# Altium footprint library 14-Inductors.PcbLib: 164 footprints (part 6 of 11)
Each footprint in its own frame and in the unit in brackets; x right, y up, seen from the top. Pads: shape width x height; smd on the part's side, far side on the other; paste and mask are expansions set on the pad; w line width, h text height; cw(c..) or ccw(c..) is an arc to the next point about the centre after c.
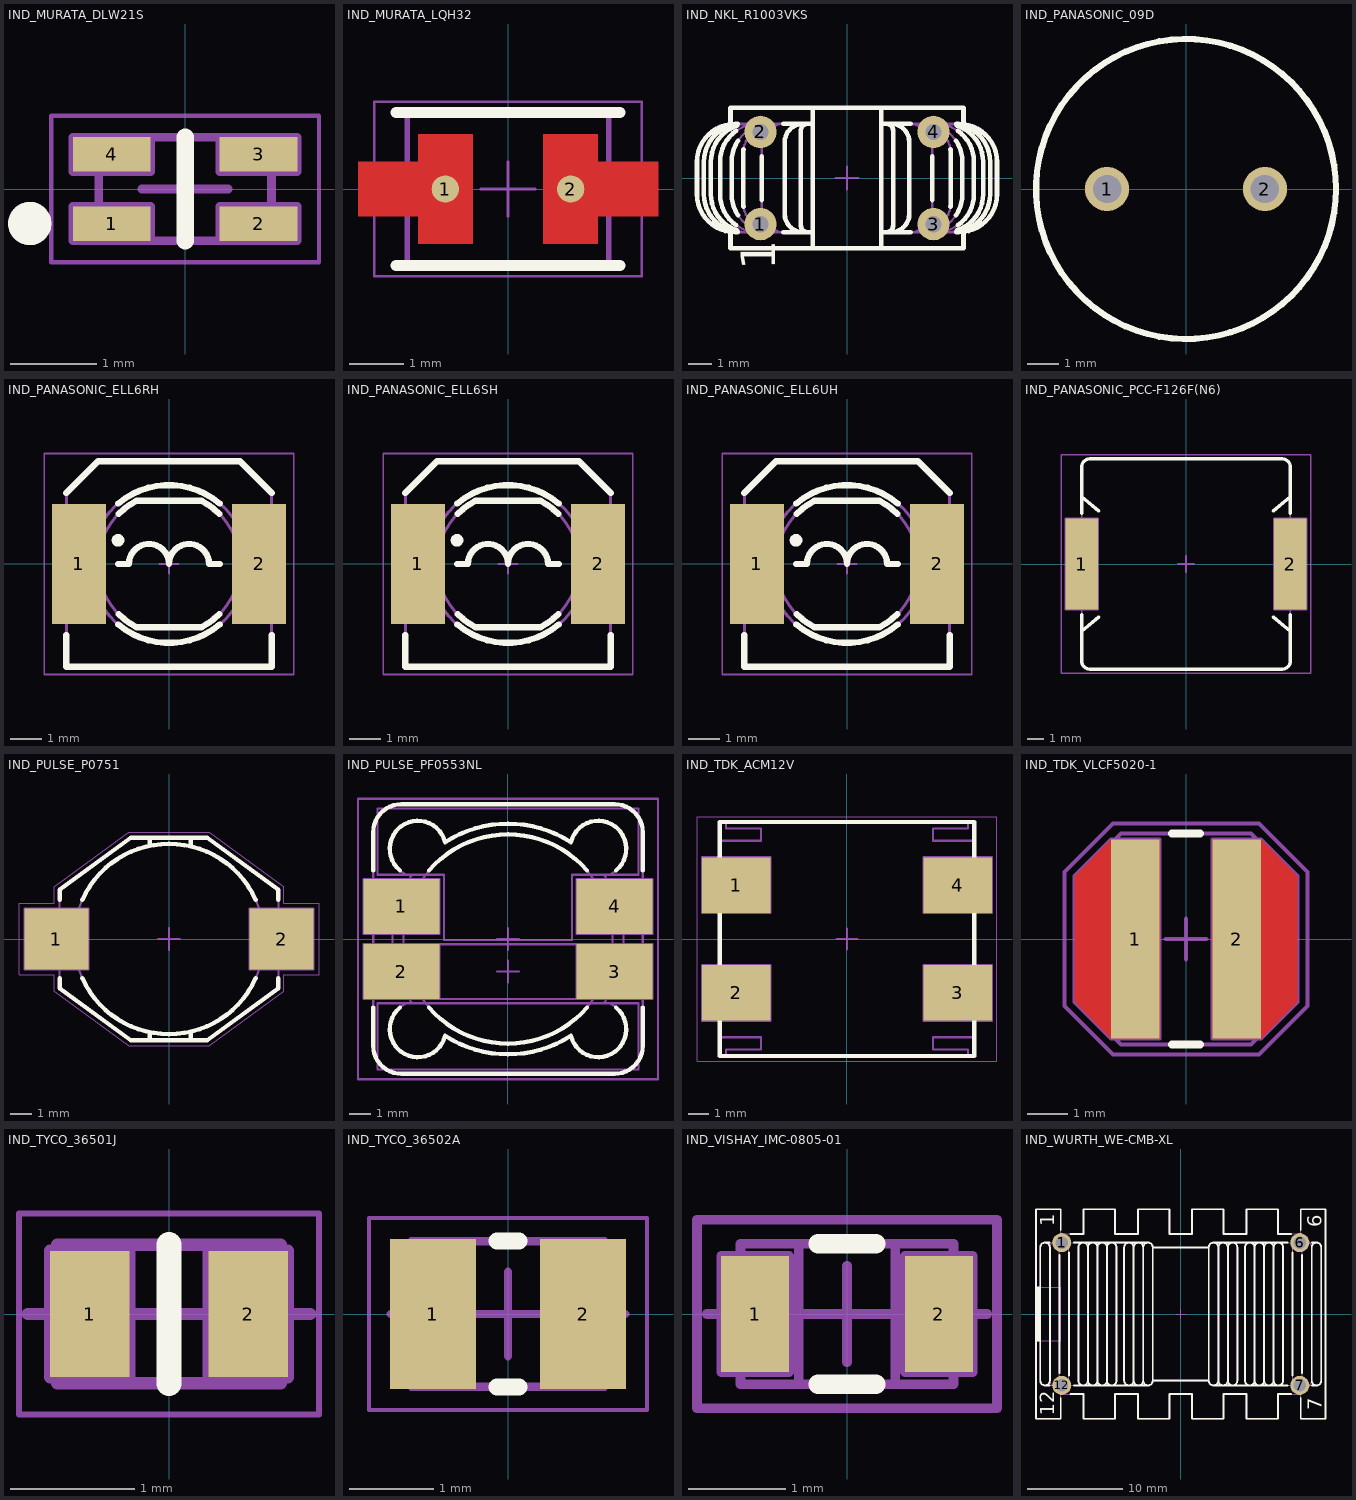
[diagram p5: the footprints below, top view; thin cyan lines are the x and y axes]

## IND_MURATA_DLW21S [mm] "Common Mode Choke Coil, DLW21S Series - Body 2 x 1.2mm"
height 1.4
pads (4):
  rect 0.9x0.4 smd: 1(-0.85,-0.4) 2(0.85,-0.4) 3(0.85,0.4) 4(-0.85,0.4)
Top Overlay:
  circle w0.25: c-1.8,-0.4 r0.125
  lines w0.2: 0,-0.6 0,0.6
Mechanical 8:
  lines w0.1: -0.5,0 0,0 ; 0,-0.5 0,0 ; 0,0.5 0,0 ; 0.5,0 0,0 ; -1.3,-0.6 -0.4,-0.6 -0.4,-0.2 -1.3,-0.2 ; -1.3,-0.6 -1.3,-0.2 ; -1.3,-0.6 -0.85,-0.4 -1.3,-0.2 ; -1.3,0.2 -0.4,0.2 -0.4,0.6 -1.3,0.6 ; -1.3,0.2 -1.3,0.6 ; -1.3,0.2 -0.85,0.4 -1.3,0.6 ; 1.3,-0.6 1.3,-0.2 ; 1.3,-0.6 1.3,-0.2 ; 1.3,-0.6 0.4,-0.6 0.4,-0.2 1.3,-0.2 ; 1.3,-0.6 0.85,-0.4 1.3,-0.2 ; 1.3,0.2 1.3,0.6 ; 1.3,0.2 1.3,0.6 ; 1.3,0.2 0.4,0.2 0.4,0.6 1.3,0.6 ; 1.3,0.2 0.85,0.4 1.3,0.6
Mechanical 14:
  circle w0.25: c-1.8,-0.4 r0.125
  lines w0.1: -1,-0.6 1,-0.6 1,0.6 -1,0.6 -1,-0.6
Mechanical 15:
  lines w0.05: -1.55,-0.85 1.55,-0.85 1.55,0.85 -1.55,0.85 -1.55,-0.85
3D body "IND_MURATA_DLW21S.stp": height 1.4, standoff 0, extent -1,-0.6 1,0.6

## IND_MURATA_LQH32 [mm] "Chip Inductor, 3.40mm L X 2.50mm W X 2.20mm H, MURATA LQH32 Serie"
height 2.2
pads (2):
  round 0.5 smd paste-0.26 mask-0.26: 1(-1.15,0) 2(1.15,0)
Top Layer:
  region: -2.75,-0.5 -1.65,-0.5 -1.65,-1 -0.65,-1 -0.65,1 -1.65,1 -1.65,0.5 -2.75,0.5
  region: 2.75,0.5 1.65,0.5 1.65,1 0.65,1 0.65,-1 1.65,-1 1.65,-0.5 2.75,-0.5
Top Overlay:
  lines w0.2: -2.05,-1.4 2.05,-1.4 ; -2.05,1.4 2.05,1.4
Mechanical 14:
  lines w0.1: -1.85,-1.35 1.85,-1.35 1.85,1.35 -1.85,1.35 -1.85,-1.35
Mechanical 15:
  lines w0.05: -0.5,0 0.5,0 ; 0,-0.5 0,0.5 ; -2.45,-1.6 2.45,-1.6 2.45,1.6 -2.45,1.6 -2.45,-1.6
3D body "IND_MURATA_LQH32.stp": height 2.2, standoff 0, extent -1.75,-1.25 1.75,1.25

## IND_NKL_R1003VKS [mm] "Current Compensated Chokes R1003VKS Serie"
height 13
pads (4):
  round 1.4 hole 0.7: 1(-3.75,-2) 2(-3.75,2) 3(3.75,-2) 4(3.75,2)
Top Overlay:
  lines w0.2: -5.05,-2.338 -5.05,-3.05 5.05,-3.05 5.05,-2.338 ; -5.05,2.338 -5.05,3.05 5.05,3.05 5.05,2.338 ; -4.799,-2.05 cw(c-3.85,-0.7) -5.5,-0.7 -5.5,0.7 cw(c-3.85,0.7) -4.799,2.05 ; -4.765,-2.267 cw(c-4.25,-0.7) -5.9,-0.7 -5.9,0.7 cw(c-4.25,0.7) -4.765,2.267 ; -4.744,-2.339 cw(c-4.55,-0.7) -6.2,-0.7 -6.2,0.7 cw(c-4.55,0.7) -4.744,2.339 ; -4.74,-2.35 -4.85,-2.35 cw(c-4.85,-0.7) -6.5,-0.7 -6.5,0.7 cw(c-4.85,0.7) -4.85,2.35 -4.74,2.35 ; -4.725,-1.611 cw(c-3.35,-0.7) -5,-0.7 -5,0.7 cw(c-3.35,0.7) -4.725,1.611 ; -4.485,-1.25 cw(c-3.2,-1.05) -4.5,-1.05 -4.5,1.05 cw(c-3.2,1.05) -4.485,1.25 ; -3.7,-0.951 -3.7,0.951 ; -2.76,-2.35 -1.49,-2.35 ; -2.759,-2.348 ccw(c-2.7,-1.35) -2.7,-2.35 ; -2.759,2.348 cw(c-2.7,1.35) -2.7,2.35 ; -2.76,2.35 -1.49,2.35 ; -1.9,-2.35 cw(c-1.9,-1.55) -2.7,-1.55 -2.7,1.55 cw(c-1.9,1.55) -1.9,2.35 ; -1.7,-2.35 cw(c-1.7,-2.05) -2,-2.05 -2,2.05 cw(c-1.7,2.05) -1.7,2.35 ; -1.49,-3.05 -1.49,3.05 ; 1.49,-3.05 1.49,3.05 ; 1.49,-2.35 2.76,-2.35 ; 1.49,2.35 2.76,2.35 ; 1.7,-2.35 ccw(c1.7,-2.05) 2,-2.05 2,2.05 ccw(c1.7,2.05) 1.7,2.35 ; 1.9,-2.35 ccw(c1.9,-1.55) 2.7,-1.55 2.7,1.55 ccw(c1.9,1.55) 1.9,2.35 ; 2.7,-2.35 ccw(c2.7,-1.35) 2.759,-2.348 ; 2.7,2.35 cw(c2.7,1.35) 2.759,2.348 ; 3.7,-0.951 3.7,0.951 ; 4.485,-1.25 ccw(c3.2,-1.05) 4.5,-1.05 4.5,1.05 ccw(c3.2,1.05) 4.485,1.25 ; 4.725,-1.611 ccw(c3.35,-0.7) 5,-0.7 5,0.7 ccw(c3.35,0.7) 4.725,1.611 ; 4.74,-2.35 4.85,-2.35 ccw(c4.85,-0.7) 6.5,-0.7 6.5,0.7 ccw(c4.85,0.7) 4.85,2.35 4.74,2.35 ; 4.744,-2.339 ccw(c4.55,-0.7) 6.2,-0.7 6.2,0.7 ccw(c4.55,0.7) 4.744,2.339 ; 4.765,-2.267 ccw(c4.25,-0.7) 5.9,-0.7 5.9,0.7 ccw(c4.25,0.7) 4.765,2.267 ; 4.799,-2.05 ccw(c3.85,-0.7) 5.5,-0.7 5.5,0.7 ccw(c3.85,0.7) 4.799,2.05
  text "1" at -3.1,-4 h1.5
Mechanical 8:
  lines w0.1: -4.25,-2 -3.75,-2 ; -4.25,2 -3.75,2 ; -3.75,-2.5 -3.75,-2 ; -3.75,-1.5 -3.75,-2 ; -3.75,1.5 -3.75,2 ; -3.75,2.5 -3.75,2 ; -3.25,-2 -3.75,-2 ; -3.25,2 -3.75,2 ; -0.5,0 0,0 ; 0,-0.5 0,0 ; 0,0.5 0,0 ; 0.5,0 0,0 ; 3.25,-2 3.75,-2 ; 3.25,2 3.75,2 ; 3.75,-2.5 3.75,-2 ; 3.75,-1.5 3.75,-2 ; 3.75,1.5 3.75,2 ; 3.75,2.5 3.75,2 ; 4.25,-2 3.75,-2 ; 4.25,2 3.75,2
Mechanical 14:
  lines w0.1: -5.05,-2.338 -5.05,-3.05 5.05,-3.05 5.05,-2.338 ; -5.05,2.338 -5.05,3.05 5.05,3.05 5.05,2.338 ; -4.55,-2.35 cw(c-4.55,-0.7) -6.2,-0.7 -6.2,0.7 cw(c-4.55,0.7) -4.55,2.35 ; -4.25,-2.35 cw(c-4.25,-0.7) -5.9,-0.7 -5.9,0.7 cw(c-4.25,0.7) -4.25,2.35 ; -3.85,-2.35 cw(c-3.85,-0.7) -5.5,-0.7 -5.5,0.7 cw(c-3.85,0.7) -3.85,2.35 ; -3.35,-2.35 cw(c-3.35,-0.7) -5,-0.7 -5,0.7 cw(c-3.35,0.7) -3.35,2.35 ; -3.2,-2.35 cw(c-3.2,-1.05) -4.5,-1.05 -4.5,1.05 cw(c-3.2,1.05) -3.2,2.35 ; -2.7,-2.35 cw(c-2.7,-1.35) -3.7,-1.35 -3.7,1.35 cw(c-2.7,1.35) -2.7,2.35 ; -1.9,-2.35 cw(c-1.9,-1.55) -2.7,-1.55 -2.7,1.55 cw(c-1.9,1.55) -1.9,2.35 ; -1.7,-2.35 cw(c-1.7,-2.05) -2,-2.05 -2,2.05 cw(c-1.7,2.05) -1.7,2.35 ; -1.49,-3.05 -1.49,3.05 ; -1.49,-2.35 -4.85,-2.35 cw(c-4.85,-0.7) -6.5,-0.7 -6.5,0.7 cw(c-4.85,0.7) -4.85,2.35 -1.49,2.35 ; 1.49,-3.05 1.49,3.05 ; 1.49,-2.35 4.85,-2.35 ccw(c4.85,-0.7) 6.5,-0.7 6.5,0.7 ccw(c4.85,0.7) 4.85,2.35 1.49,2.35 ; 1.7,-2.35 ccw(c1.7,-2.05) 2,-2.05 2,2.05 ccw(c1.7,2.05) 1.7,2.35 ; 1.9,-2.35 ccw(c1.9,-1.55) 2.7,-1.55 2.7,1.55 ccw(c1.9,1.55) 1.9,2.35 ; 2.7,-2.35 ccw(c2.7,-1.35) 3.7,-1.35 3.7,1.35 ccw(c2.7,1.35) 2.7,2.35 ; 3.2,-2.35 ccw(c3.2,-1.05) 4.5,-1.05 4.5,1.05 ccw(c3.2,1.05) 3.2,2.35 ; 3.35,-2.35 ccw(c3.35,-0.7) 5,-0.7 5,0.7 ccw(c3.35,0.7) 3.35,2.35 ; 3.85,-2.35 ccw(c3.85,-0.7) 5.5,-0.7 5.5,0.7 ccw(c3.85,0.7) 3.85,2.35 ; 4.25,-2.35 ccw(c4.25,-0.7) 5.9,-0.7 5.9,0.7 ccw(c4.25,0.7) 4.25,2.35 ; 4.55,-2.35 ccw(c4.55,-0.7) 6.2,-0.7 6.2,0.7 ccw(c4.55,0.7) 4.55,2.35
  text "1" at -3.1,-4 h1.5
3D body "IND_NKL_R1003VKS.stp": height 13, standoff -3.6, extent -6.5,-3.05 6.5,3.05

## IND_PANASONIC_09D [mm] "Radial Leaded Wire Wound Inductor D=9.5mm"
height 8.9
pads (2):
  round 1.4 hole 0.9: 1(-2.5,0) 2(2.5,0)
Top Overlay:
  circle w0.2: c0,0 r4.75
Mechanical 14:
  circle w0.1: c0,0 r4.75
3D body "IND_PANASONIC_09D.stp": height 8.9, standoff -4.1, extent -4.75,-4.75 4.75,4.75

## IND_PANASONIC_ELL6RH [mm] "SMD Choke Coil, Body 6.9x6.5mm"
height 2.8
pads (2):
  rect 1.7x3.8 smd: 1(-2.85,0) 2(2.85,0)
Top Overlay:
  circle w0.2: c-1.615,0.75 r0.1
  lines w0.2: -3.25,-2.25 -3.25,-3.25 3.25,-3.25 3.25,-2.25 ; -3.25,2.25 -2.25,3.25 2.25,3.25 3.25,2.25 ; -1.615,0 -1.27,0 cw(c-0.635,0) 0,0 cw(c0.635,0) 1.27,0 1.615,0 ; -1.607,-1.915 ccw(c0,0) 1.607,-1.915 ; -1.607,1.915 cw(c0,0) 1.607,1.915 ; -1.591,-1.591 ccw(c0,0) -1.031,-2 1.031,-2 ccw(c0,0) 1.591,-1.591 ; -1.591,1.591 cw(c0,0) -1.031,2 1.031,2 cw(c0,0) 1.591,1.591
Mechanical 14:
  circle w0.1: c0,0 r2.5
  lines w0.1: -3.25,-1.65 -3.45,-1.65 -3.45,1.65 -3.25,1.65 ; 3.25,-1.65 3.45,-1.65 3.45,1.65 3.25,1.65 ; -3.25,-3.25 -3.25,2.25 -2.25,3.25 2.25,3.25 3.25,2.25 3.25,-3.25 -3.25,-3.25 ; -1.031,-2 cw(c0,0) -1.031,2 1.031,2 cw(c0,0) 1.031,-2 -1.031,-2
Mechanical 15:
  lines w0.05: -0.3,0 0.3,0 ; 0,-0.3 0,0.3 ; -3.95,-3.5 -3.95,3.5 3.95,3.5 3.95,-3.5 -3.95,-3.5
3D body "IND_PANASONIC_ELL6RH.stp": height 2.8, standoff 0, extent -3.45,-3.25 3.45,3.25

## IND_PANASONIC_ELL6SH [mm] "SMD Choke Coil, Body 6.9x6.5mm"
height 3.3
pads (2):
  rect 1.7x3.8 smd: 1(-2.85,0) 2(2.85,0)
Top Overlay:
  circle w0.2: c-1.615,0.75 r0.1
  lines w0.2: -3.25,-2.25 -3.25,-3.25 3.25,-3.25 3.25,-2.25 ; -3.25,2.25 -2.25,3.25 2.25,3.25 3.25,2.25 ; -1.615,0 -1.27,0 cw(c-0.635,0) 0,0 cw(c0.635,0) 1.27,0 1.615,0 ; -1.607,-1.915 ccw(c0,0) 1.607,-1.915 ; -1.607,1.915 cw(c0,0) 1.607,1.915 ; -1.591,-1.591 ccw(c0,0) -1.031,-2 1.031,-2 ccw(c0,0) 1.591,-1.591 ; -1.591,1.591 cw(c0,0) -1.031,2 1.031,2 cw(c0,0) 1.591,1.591
Mechanical 14:
  circle w0.1: c0,0 r2.5
  lines w0.1: -3.25,-1.65 -3.45,-1.65 -3.45,1.65 -3.25,1.65 ; 3.25,-1.65 3.45,-1.65 3.45,1.65 3.25,1.65 ; -3.25,-3.25 -3.25,2.25 -2.25,3.25 2.25,3.25 3.25,2.25 3.25,-3.25 -3.25,-3.25 ; -1.031,-2 cw(c0,0) -1.031,2 1.031,2 cw(c0,0) 1.031,-2 -1.031,-2
Mechanical 15:
  lines w0.05: -0.3,0 0.3,0 ; 0,-0.3 0,0.3 ; -3.95,-3.5 -3.95,3.5 3.95,3.5 3.95,-3.5 -3.95,-3.5
3D body "IND_PANASONIC_ELL6SH.stp": height 3.3, standoff 0, extent -3.45,-3.25 3.45,3.25

## IND_PANASONIC_ELL6UH [mm] "SMD Choke Coil, Body 6.9x6.5mm"
height 5
pads (2):
  rect 1.7x3.8 smd: 1(-2.85,0) 2(2.85,0)
Top Overlay:
  circle w0.2: c-1.615,0.75 r0.1
  lines w0.2: -3.25,-2.25 -3.25,-3.25 3.25,-3.25 3.25,-2.25 ; -3.25,2.25 -2.25,3.25 2.25,3.25 3.25,2.25 ; -1.615,0 -1.27,0 cw(c-0.635,0) 0,0 cw(c0.635,0) 1.27,0 1.615,0 ; -1.607,-1.915 ccw(c0,0) 1.607,-1.915 ; -1.607,1.915 cw(c0,0) 1.607,1.915 ; -1.591,-1.591 ccw(c0,0) -1.031,-2 1.031,-2 ccw(c0,0) 1.591,-1.591 ; -1.591,1.591 cw(c0,0) -1.031,2 1.031,2 cw(c0,0) 1.591,1.591
Mechanical 14:
  circle w0.1: c0,0 r2.5
  lines w0.1: -3.25,-1.65 -3.45,-1.65 -3.45,1.65 -3.25,1.65 ; 3.25,-1.65 3.45,-1.65 3.45,1.65 3.25,1.65 ; -3.25,-3.25 3.25,-3.25 3.25,2.25 2.25,3.25 -2.25,3.25 -3.25,2.25 -3.25,-3.25 ; -1.031,-2 cw(c0,0) -1.031,2 1.031,2 cw(c0,0) 1.031,-2 -1.031,-2
Mechanical 15:
  lines w0.05: -0.3,0 0.3,0 ; 0,-0.3 0,0.3 ; -3.95,-3.5 3.95,-3.5 3.95,3.5 -3.95,3.5 -3.95,-3.5
3D body "IND_PANASONIC_ELL6UH.stp": height 5, standoff 0, extent -3.45,-3.25 3.45,3.25

## IND_PANASONIC_PCC-F126F(N6) [mm] "SMD Inductor  Body Width 12.5mm Body Lenght 12.5mm Height 5.7mm, PANASONIC PCC-F126(N6) Serie"
height 5.7
pads (2):
  rect 2x5.6 smd: 1(-6.4,0) 2(6.4,0)
Top Overlay:
  lines w0.2: -6.4,-4.125 -5.35,-3.25 ; -6.4,-3.1 -6.4,-5.95 ccw(c-5.9,-5.95) -5.9,-6.45 5.9,-6.45 ccw(c5.9,-5.95) 6.4,-5.95 6.4,-3.1 ; -6.4,3.1 -6.4,5.95 cw(c-5.9,5.95) -5.9,6.45 5.9,6.45 cw(c5.9,5.95) 6.4,5.95 6.4,3.1 ; -6.4,4.125 -5.35,3.25 ; 5.35,-3.25 6.4,-4.125 ; 5.35,3.25 6.4,4.125
Mechanical 8:
  lines w0.1: -6.9,0 -6.4,0 ; -6.4,-0.5 -6.4,0 ; -6.4,0.5 -6.4,0 ; -5.9,0 -6.4,0 ; -0.5,0 0,0 ; 0,-0.5 0,0 ; 0,0.5 0,0 ; 0.5,0 0,0 ; 5.9,0 6.4,0 ; 6.4,-0.5 6.4,0 ; 6.4,0.5 6.4,0 ; 6.9,0 6.4,0 ; -7.4,-2.8 -7.4,2.8 -5.4,2.8 -5.4,-2.8 -7.4,-2.8 ; 5.4,-2.8 5.4,2.8 7.4,2.8 7.4,-2.8 5.4,-2.8
Mechanical 14:
  lines w0.1: -6.4,-5.95 ccw(c-5.9,-5.95) -5.9,-6.45 5.9,-6.45 ccw(c5.9,-5.95) 6.4,-5.95 6.4,5.95 ccw(c5.9,5.95) 5.9,6.45 -5.9,6.45 ccw(c-5.9,5.95) -6.4,5.95 -6.4,-5.95
Mechanical 15:
  lines w0.1: -7.65,-6.7 7.65,-6.7 7.65,6.7 -7.65,6.7 -7.65,-6.7
3D body "IND_PANASONIC_PCC-F126F(N6).stp": height 5.7, standoff -0.3, extent -6.25,-6.25 6.25,6.25

## IND_PULSE_P0751 [mm] "SMD Power Inductor, Body Width 9.4mm Body Lenght 12.95mm Height 5.46mm, PULSE P0751/52NL Serie"
height 5.46
pads (2):
  rect 2.92x2.79 smd: 1(-5.145,0) 2(5.145,0)
Top Overlay:
  lines w0.2: -5,-1.795 -5,-2.25 -1.75,-4.625 1.75,-4.625 5,-2.25 5,-1.795 ; -5,1.795 -5,2.25 -1.75,4.625 1.75,4.625 5,2.25 5,1.795 ; -3.962,-1.795 ccw(c0,0) 3.962,-1.795 ; -3.962,1.795 cw(c0,0) 3.962,1.795 ; -0.886,-4.625 -0.886,-4.259 ; -0.886,4.259 -0.886,4.625 ; 0.999,-4.625 0.999,-4.234 ; 0.999,4.234 0.999,4.625
Mechanical 8:
  lines w0.1: -5.645,0 -5.145,0 ; -5.145,-0.5 -5.145,0 ; -5.145,0.5 -5.145,0 ; -4.645,0 -5.145,0 ; -0.5,0 0,0 ; 0,-0.5 0,0 ; 0,0.5 0,0 ; 0.5,0 0,0 ; 4.645,0 5.145,0 ; 5.145,-0.5 5.145,0 ; 5.145,0.5 5.145,0 ; 5.645,0 5.145,0 ; -6.605,-1.395 -6.605,1.395 -3.685,1.395 -3.685,-1.395 -6.605,-1.395 ; 3.685,-1.395 3.685,1.395 6.605,1.395 6.605,-1.395 3.685,-1.395
Mechanical 14:
  circle w0.1: c0,0 r4.35
  lines w0.1: -0.886,-4.625 -0.886,-4.259 ; -0.886,4.259 -0.886,4.625 ; 0.999,-4.625 0.999,-4.234 ; 0.999,4.234 0.999,4.625 ; -6.3,-1.25 -5,-1.25 -5,-2.25 -1.75,-4.625 1.75,-4.625 5,-2.25 5,-1.25 6.3,-1.25 6.3,1.25 5,1.25 5,2.25 1.75,4.625 -1.75,4.625 -5,2.25 -5,1.25 -6.3,1.25 -6.3,-1.25
Mechanical 15:
  lines w0.05: -6.855,-1.645 -6.855,1.645 -5.25,1.645 -5.25,2.377 -1.832,4.875 1.832,4.875 5.25,2.377 5.25,1.645 6.855,1.645 6.855,-1.645 5.25,-1.645 5.25,-2.377 1.832,-4.875 -1.832,-4.875 -5.25,-2.377 -5.25,-1.645 -6.855,-1.645
3D body "IND_PULSE_P0751.stp": height 4.75, standoff 0, extent -6.3,-4.625 6.3,4.625

## IND_PULSE_PF0553NL [mm] "SMD Power Inductor, Body Width 12.5mm Body Lenght 12.5mm Height 8mm, PULSE PF0553NL Serie"
height 8
pads (4):
  rect 3.53x2.54 smd: 1(-4.94,1.51) 2(-4.94,-1.51) 3(4.94,-1.51) 4(4.94,1.51)
Top Overlay:
  lines w0.2: -6.25,-3.18 -6.25,-4.95 ccw(c-4.95,-4.95) -4.95,-6.25 4.95,-6.25 ccw(c4.95,-4.95) 6.25,-4.95 6.25,-3.18 ; -6.25,3.18 -6.25,4.95 cw(c-4.95,4.95) -4.95,6.25 4.95,6.25 cw(c4.95,4.95) 6.25,4.95 6.25,3.18 ; -5.01,-3.18 ccw(c-4.182,-4.183) -2.918,-4.484 ccw(c0,0) 2.918,-4.484 ccw(c4.183,-4.183) 5.01,-3.18 ; -5.01,3.18 cw(c-4.182,4.183) -2.918,4.484 cw(c0,0) 2.918,4.484 cw(c4.183,4.183) 5.01,3.18 ; -3.662,-3.18 ccw(c0,0) 3.662,-3.18 ; -3.662,3.18 cw(c0,0) 3.662,3.18
Mechanical 8:
  lines w0.1: -5.44,-1.51 -4.94,-1.51 ; -5.44,1.51 -4.94,1.51 ; -4.94,-2.01 -4.94,-1.51 ; -4.94,-1.01 -4.94,-1.51 ; -4.94,1.01 -4.94,1.51 ; -4.94,2.01 -4.94,1.51 ; -4.44,-1.51 -4.94,-1.51 ; -4.44,1.51 -4.94,1.51 ; -0.5,-1.51 0,-1.51 ; -0.5,0 0,0 ; 0,-2.01 0,-1.51 ; 0,-1.01 0,-1.51 ; 0,-0.5 0,0 ; 0,0.5 0,0 ; 0.5,-1.51 0,-1.51 ; 0.5,0 0,0 ; 4.44,-1.51 4.94,-1.51 ; 4.44,1.51 4.94,1.51 ; 4.94,-2.01 4.94,-1.51 ; 4.94,-1.01 4.94,-1.51 ; 4.94,1.01 4.94,1.51 ; 4.94,2.01 4.94,1.51 ; 5.44,-1.51 4.94,-1.51 ; 5.44,1.51 4.94,1.51 ; -3.175,-2.78 3.175,-2.78 ; -3.175,-2.78 -3.175,-0.24 ; -3.175,-2.78 -6.705,-2.78 -6.705,-0.24 -3.175,-0.24 ; -3.175,-0.24 3.175,-0.24 ; 3.175,-2.78 3.175,-0.24 ; 3.175,-2.78 6.705,-2.78 6.705,-0.24 3.175,-0.24 ; -6.705,0.24 -6.705,2.78 -3.175,2.78 -3.175,0.24 -6.705,0.24 ; -6.05,-6.05 -6.05,-2.98 6.05,-2.98 6.05,-6.05 -6.05,-6.05 ; -6.05,2.98 -6.05,6.05 6.05,6.05 6.05,2.98 2.975,2.98 2.975,-0.04 -2.975,-0.04 -2.975,2.98 -6.05,2.98 ; 3.175,0.24 3.175,2.78 6.705,2.78 6.705,0.24 3.175,0.24
Mechanical 14:
  circle w0.1: c0,0 r4.85
  lines w0.1: -6.25,-4.95 ccw(c-4.95,-4.95) -4.95,-6.25 4.95,-6.25 ccw(c4.95,-4.95) 6.25,-4.95 6.25,4.95 ccw(c4.95,4.95) 4.95,6.25 -4.95,6.25 ccw(c-4.95,4.95) -6.25,4.95 -6.25,-4.95 ; -4.484,-2.918 ccw(c-4.182,-4.183) -2.918,-4.484 ccw(c0,0) 2.918,-4.484 ccw(c4.183,-4.183) 4.484,-2.918 ccw(c0,0) 4.484,2.918 ccw(c4.183,4.183) 2.918,4.484 ccw(c0,0) -2.918,4.484 ccw(c-4.182,4.183) -4.484,2.918 ccw(c0,0) -4.484,-2.918
Mechanical 15:
  lines w0.1: -6.955,-6.5 6.955,-6.5 6.955,6.5 -6.955,6.5 -6.955,-6.5
3D body "IND_PULSE_PF0553NL.stp": height 8, standoff 0, extent -6.25,-6.315 6.25,6.315

## IND_TDK_ACM12V [mm] "Common Mode Filters For Automotive Power Line, 12mm L X 11mm W X 6mm H, TDK ACM70V Serie"
height 6
pads (4):
  rect 3.3x2.7 smd: 1(-5.35,2.6) 2(-5.35,-2.6) 3(5.35,-2.6) 4(5.35,2.6)
Top Overlay:
  lines w0.2: -6.15,-5.65 6.15,-5.65 6.15,5.65 -6.15,5.65 -6.15,-5.65
Mechanical 8:
  lines w0.1: -5.85,-2.6 -5.35,-2.6 ; -5.85,2.6 -5.35,2.6 ; -5.35,-3.1 -5.35,-2.6 ; -5.35,-2.1 -5.35,-2.6 ; -5.35,2.1 -5.35,2.6 ; -5.35,3.1 -5.35,2.6 ; -4.85,-2.6 -5.35,-2.6 ; -4.85,2.6 -5.35,2.6 ; -0.5,0 0,0 ; 0,-0.5 0,0 ; 0,0.5 0,0 ; 0.5,0 0,0 ; 4.85,-2.6 5.35,-2.6 ; 4.85,2.6 5.35,2.6 ; 5.35,-3.1 5.35,-2.6 ; 5.35,-2.1 5.35,-2.6 ; 5.35,2.1 5.35,2.6 ; 5.35,3.1 5.35,2.6 ; 5.85,-2.6 5.35,-2.6 ; 5.85,2.6 5.35,2.6 ; -7,-3.95 -3.7,-3.95 -3.7,-1.25 -7,-1.25 -7,-3.95 ; -7,1.25 -3.7,1.25 -3.7,3.95 -7,3.95 -7,1.25 ; 3.7,-3.95 7,-3.95 7,-1.25 3.7,-1.25 3.7,-3.95 ; 3.7,1.25 7,1.25 7,3.95 3.7,3.95 3.7,1.25
Mechanical 14:
  lines w0.1: -6.15,-4.75 -6.15,4.75 -4.15,4.75 -4.15,5.35 -5.85,5.35 -5.85,5.65 5.85,5.65 5.85,5.35 4.15,5.35 4.15,4.75 6.15,4.75 6.15,-4.75 4.15,-4.75 4.15,-5.35 5.85,-5.35 5.85,-5.65 -5.85,-5.65 -5.85,-5.35 -4.15,-5.35 -4.15,-4.75 -6.15,-4.75
Mechanical 15:
  lines w0.05: -7.25,-5.9 7.25,-5.9 7.25,5.9 -7.25,5.9 -7.25,-5.9
3D body "IND_TDK_ACM12V.stp": height 6, standoff 0, extent -6.15,-5.65 6.15,5.65

## IND_TDK_VLCF5020-1 [mm] "SMD Inductor, 5mm L X 5mm W X 2mm H, TDK VLCF5020-1 Case"
height 2
pads (2):
  rect 1.2x4.9 smd: 1(-1.25,0) 2(1.25,0)
Top Layer:
  region: -2.75,-1.55 -1.85,-2.45 -0.65,-2.45 -0.65,2.45 -1.85,2.45 -2.75,1.55
  region: 2.75,1.55 1.85,2.45 0.65,2.45 0.65,-2.45 1.85,-2.45 2.75,-1.55
Top Overlay:
  lines w0.2: -0.35,-2.6 0.35,-2.6 ; -0.35,2.6 0.35,2.6
Top Paste:
  region: -2.75,-1.55 -1.85,-2.45 -0.65,-2.45 -0.65,2.45 -1.85,2.45 -2.75,1.55
  region: 2.75,1.55 1.85,2.45 0.65,2.45 0.65,-2.45 1.85,-2.45 2.75,-1.55
Top Solder:
  region: 2.85,1.591 1.891,2.55 0.55,2.55 0.55,-2.55 1.891,-2.55 2.85,-1.591
  region: -2.85,-1.591 -1.891,-2.55 -0.55,-2.55 -0.55,2.55 -1.891,2.55 -2.85,1.591
Mechanical 8:
  lines w0.1: -2.2,0 -1.7,0 ; -1.7,-0.5 -1.7,0 ; -1.7,0.5 -1.7,0 ; -1.25,-0.5 -1.25,0 ; -1.25,0.5 -1.25,0 ; -0.75,0 -1.25,0 ; -0.5,0 0,0 ; 0,-0.5 0,0 ; 0,0.5 0,0 ; 0.5,0 0,0 ; 0.75,0 1.25,0 ; 1.25,-0.5 1.25,0 ; 1.25,0.5 1.25,0 ; 1.7,-0.5 1.7,0 ; 1.7,0.5 1.7,0 ; 2.2,0 1.7,0 ; -2.75,-1.55 -2.75,1.55 -1.85,2.45 -0.65,2.45 -0.65,-2.45 -1.85,-2.45 -2.75,-1.55 ; 0.65,-2.45 0.65,2.45 1.85,2.45 2.75,1.55 2.75,-1.55 1.85,-2.45 0.65,-2.45
Mechanical 14:
  lines w0.1: -2.6,-1.6 -1.6,-2.6 1.6,-2.6 2.6,-1.6 2.6,1.6 1.6,2.6 -1.6,2.6 -2.6,1.6 -2.6,-1.6
Mechanical 15:
  lines w0.1: -3,-1.654 -3,1.654 -1.804,2.85 1.804,2.85 3,1.654 3,-1.654 1.804,-2.85 -1.804,-2.85 -3,-1.654
3D body "IND_TDK_VLCF5020-1.stp": height 2, standoff 0, extent -2.6,-2.6 2.6,2.6

## IND_TYCO_36501J [mm] "Chip Inductor, 2-Leads, Body 108 x 1.12mm, TYCO 3650J Serie"
height 1.02
pads (2):
  rect 0.64x1.02 smd: 1(-0.64,0) 2(0.64,0)
Top Overlay:
  lines w0.2: 0,-0.56 0,0.56
Mechanical 8:
  lines w0.1: -1.14,0 -0.64,0 ; -0.64,-0.5 -0.64,0 ; -0.64,0.5 -0.64,0 ; -0.5,0 0,0 ; 0,-0.5 0,0 ; 0,0.5 0,0 ; 0.5,0 0,0 ; 0.64,-0.5 0.64,0 ; 0.64,0.5 0.64,0 ; 1.14,0 0.64,0 ; -0.96,-0.51 -0.32,-0.51 -0.32,0.51 -0.96,0.51 -0.96,-0.51 ; 0.32,-0.51 0.96,-0.51 0.96,0.51 0.32,0.51 0.32,-0.51
Mechanical 14:
  lines w0.1: -0.9,-0.56 -0.9,0.56 0.9,0.56 0.9,-0.56 -0.9,-0.56
Mechanical 15:
  lines w0.05: -1.21,-0.81 1.21,-0.81 1.21,0.81 -1.21,0.81 -1.21,-0.81
3D body "IND_TYCO_36501J.stp": height 1.02, standoff 0, extent -0.9,-0.56 0.9,0.56

## IND_TYCO_36502A [mm] "Chip Inductor, 2-Leads, EIA 0805, Metric 2012, Body L 2.29 x W 1.73mm x H 1.52mm"
height 1.52
pads (2):
  rect 1.02x1.78 smd: 1(-0.89,0) 2(0.89,0)
Top Overlay:
  lines w0.2: -0.13,-0.865 0.13,-0.865 ; -0.13,0.865 0.13,0.865
Mechanical 8:
  lines w0.1: -1.39,0 -0.89,0 ; -0.89,-0.5 -0.89,0 ; -0.89,0.5 -0.89,0 ; 0.89,-0.5 0.89,0 ; 0.89,0.5 0.89,0 ; 1.39,0 0.89,0 ; 0,0 -0.5,0 0,0 ; 0,0 0,-0.5 0,0 ; 0,0 0.5,0 0,0 ; 0,0 0,0.5 0,0
Mechanical 14:
  lines w0.1: -1.145,-0.865 1.145,-0.865 1.145,0.865 -1.145,0.865 -1.145,-0.865
Mechanical 15:
  lines w0.05: -1.65,-1.14 1.65,-1.14 1.65,1.14 -1.65,1.14 -1.65,-1.14
3D body "IND_TYCO_36502A.stp": height 1.52, standoff 0, extent -1.145,-0.865 1.145,0.865

## IND_VISHAY_IMC-0805-01 [mm] "Chip Inductor, EIA 0805, Metric 2012, Body 2.0x1.25mm"
height 1.4
pads (2):
  rect 0.7x1.2 smd: 1(-0.95,0) 2(0.95,0)
Top Overlay:
  lines w0.2: -0.3,-0.725 0.3,-0.725 ; -0.3,0.725 0.3,0.725
Mechanical 8:
  lines w0.1: -1.45,0 -0.95,0 ; -0.95,-0.5 -0.95,0 ; -0.95,0.5 -0.95,0 ; -0.5,0 0,0 ; 0,-0.5 0,0 ; 0,0.5 0,0 ; 0.5,0 0,0 ; 0.95,-0.5 0.95,0 ; 0.95,0.5 0.95,0 ; 1.45,0 0.95,0 ; -1.3,-0.6 -1.3,0.6 -0.6,0.6 -0.6,-0.6 -1.3,-0.6 ; 0.6,-0.6 1.3,-0.6 1.3,0.6 0.6,0.6 0.6,-0.6
Mechanical 14:
  lines w0.1: -0.5,-0.725 -0.5,0.725 ; 0.5,-0.725 0.5,0.725 ; -1.1,-0.725 -1.1,0.725 1.1,0.725 1.1,-0.725 -1.1,-0.725
Mechanical 15:
  lines w0.1: -1.55,-0.975 -1.55,0.975 1.55,0.975 1.55,-0.975 -1.55,-0.975
3D body "IND_VISHAY_IMC-0805-01.stp": height 1.4, standoff 0, extent -1.1,-0.725 1.1,0.725

## IND_WURTH_WE-CMB-XL [mm] "WURTH Common Mode Choke WE-CMB XL Serie"
height 35
pads (4):
  round 2 hole 1.3: 1(-12.5,7.5) 6(12.5,7.5) 7(12.5,-7.5) 12(-12.5,-7.5)
Top Overlay:
  lines w0.2: -15.2,-2.8 -14.75,-2.8 ; -15.2,2.8 -14.75,2.8 ; -15,-2.8 -15,2.8 ; -14.9,-2.8 -14.9,2.8 ; -14.25,-7.5 -13.8,-7.5 ; -14.25,7.5 -13.8,7.5 ; -12.75,-6.224 -12.75,6.224 ; -12.6,-8.796 -12.6,-11 -15.2,-11 -15.2,11 -12.6,11 -12.6,8.796 ; -11.75,-6.438 -11.75,6.438 ; -11.562,-8.4 -10.2,-8.4 -10.2,-11 -6.9,-11 -6.9,-8.4 -4.5,-8.4 -4.5,-11 -1.2,-11 -1.2,-8.4 1.2,-8.4 1.2,-11 4.5,-11 4.5,-8.4 6.9,-8.4 6.9,-11 10.2,-11 10.2,-8.4 11.562,-8.4 ; -11.562,8.4 -10.2,8.4 -10.2,11 -6.9,11 -6.9,8.4 -4.5,8.4 -4.5,11 -1.2,11 -1.2,8.4 1.2,8.4 1.2,11 4.5,11 4.5,8.4 6.9,8.4 6.9,11 10.2,11 10.2,8.4 11.562,8.4 ; -11.2,-7.5 -3.442,-7.5 ; -11.2,7.5 -3.442,7.5 ; 3.442,-7.5 11.2,-7.5 ; 3.442,7.5 11.2,7.5 ; 11.75,-6.438 11.75,6.438 ; 12.6,-8.796 12.6,-11 15.2,-11 15.2,11 12.6,11 12.6,8.796 ; 12.75,-6.224 12.75,6.224 ; 13.8,-7.5 14.25,-7.5 ; 13.8,7.5 14.25,7.5 ; -9.75,-7 cw(c-10.25,-7) -10.75,-7 -10.75,7 cw(c-10.25,7) -9.75,7 ; -9.75,-7 ccw(c-9.25,-7) -8.75,-7 ; -9.75,-7 -9.75,7 ; -9.75,7 cw(c-9.25,7) -8.75,7 ; -8.75,-7 ccw(c-8.25,-7) -7.75,-7 ; -8.75,-7 -8.75,7 ; -8.75,7 cw(c-8.25,7) -7.75,7 ; -7.75,-7 ccw(c-7.25,-7) -6.75,-7 -6.75,7 ccw(c-7.25,7) -7.75,7 ; -7.75,-7 -7.75,7 ; -4.942,-7 cw(c-5.442,-7) -5.942,-7 -5.942,7 cw(c-5.442,7) -4.942,7 ; -4.942,-7 ccw(c-4.442,-7) -3.942,-7 ; -4.942,-7 -4.942,7 ; -4.942,7 cw(c-4.442,7) -3.942,7 ; -3.942,-7 ccw(c-3.442,-7) -2.942,-7 ; -3.942,-7 -3.942,7 ; -3.942,7 cw(c-3.442,7) -2.942,7 ; -2.942,-7 2.942,-7 ; -2.942,-7 -2.942,7 ; -2.942,7 2.942,7 ; 2.942,-7 ccw(c3.442,-7) 3.942,-7 ; 2.942,-7 2.942,7 ; 2.942,7 cw(c3.442,7) 3.942,7 ; 3.942,-7 ccw(c4.442,-7) 4.942,-7 ; 3.942,-7 3.942,7 ; 3.942,7 cw(c4.442,7) 4.942,7 ; 4.942,-7 ccw(c5.442,-7) 5.942,-7 5.942,7 ccw(c5.442,7) 4.942,7 ; 4.942,-7 4.942,7 ; 7.75,-7 cw(c7.25,-7) 6.75,-7 6.75,7 cw(c7.25,7) 7.75,7 ; 7.75,-7 ccw(c8.25,-7) 8.75,-7 ; 7.75,-7 7.75,7 ; 7.75,7 cw(c8.25,7) 8.75,7 ; 8.75,-7 ccw(c9.25,-7) 9.75,-7 ; 8.75,-7 8.75,7 ; 8.75,7 cw(c9.25,7) 9.75,7 ; 9.75,-7 ccw(c10.25,-7) 10.75,-7 10.75,7 ccw(c10.25,7) 9.75,7 ; 9.75,-7 9.75,7 ; -14.75,-7 ccw(c-14.25,-7) -13.75,-7 -13.75,7 ccw(c-14.25,7) -14.75,7 -14.75,-7 ; 13.75,-7 ccw(c14.25,-7) 14.75,-7 14.75,7 ccw(c14.25,7) 13.75,7 13.75,-7
  text "6" at 14.8,9.1 h1.5
  text "7" at 14.8,-10.1 h1.5
  text "1" at -13.3,9.2 h1.5
  text "12" at -13.3,-10.7 h1.5
Mechanical 8:
  lines w0.1: -13,-7.5 -12.5,-7.5 ; -13,7.5 -12.5,7.5 ; -12.5,-8 -12.5,-7.5 ; -12.5,-7 -12.5,-7.5 ; -12.5,7 -12.5,7.5 ; -12.5,8 -12.5,7.5 ; -12,-7.5 -12.5,-7.5 ; -12,7.5 -12.5,7.5 ; -0.5,0 0,0 ; 0,-0.5 0,0 ; 0,0.5 0,0 ; 0.5,0 0,0 ; 12,-7.5 12.5,-7.5 ; 12,7.5 12.5,7.5 ; 12.5,-8 12.5,-7.5 ; 12.5,-7 12.5,-7.5 ; 12.5,7 12.5,7.5 ; 12.5,8 12.5,7.5 ; 13,-7.5 12.5,-7.5 ; 12.5,7.5 13,7.5 12.5,7.5
Mechanical 14:
  lines w0.1: -15.2,-2.8 -12.6,-2.8 -12.6,2.8 -15.2,2.8 ; -14.25,-7.5 -3.442,-7.5 ; -14.25,7.5 -3.442,7.5 ; 3.442,-7.5 14.25,-7.5 ; 3.442,7.5 14.25,7.5 ; -13.75,-7 cw(c-14.25,-7) -14.75,-7 -14.75,7 cw(c-14.25,7) -13.75,7 ; -13.75,-7 ccw(c-13.25,-7) -12.75,-7 ; -13.75,-7 -13.75,7 ; -13.75,7 cw(c-13.25,7) -12.75,7 ; -12.75,-7 ccw(c-12.25,-7) -11.75,-7 ; -12.75,-7 -12.75,7 ; -12.75,-7 -12.75,7 ; -12.75,7 cw(c-12.25,7) -11.75,7 ; -11.75,-7 -11.75,7 ; -11.75,-7 -11.75,7 ; -10.75,-7 ccw(c-10.25,-7) -9.75,-7 ; -10.75,-7 -10.75,7 ; -10.75,-7 -10.75,7 ; -10.75,7 cw(c-10.25,7) -9.75,7 ; -9.75,-7 ccw(c-9.25,-7) -8.75,-7 ; -9.75,-7 -9.75,7 ; -9.75,-7 -9.75,7 ; -9.75,7 cw(c-9.25,7) -8.75,7 ; -8.75,-7 ccw(c-8.25,-7) -7.75,-7 ; -8.75,-7 -8.75,7 ; -8.75,-7 -8.75,7 ; -8.75,7 cw(c-8.25,7) -7.75,7 ; -7.75,-7 ccw(c-7.25,-7) -6.75,-7 -6.75,7 ccw(c-7.25,7) -7.75,7 ; -7.75,-7 -7.75,7 ; -7.75,-7 -7.75,7 ; -4.942,-7 cw(c-5.442,-7) -5.942,-7 -5.942,7 cw(c-5.442,7) -4.942,7 ; -4.942,-7 ccw(c-4.442,-7) -3.942,-7 ; -4.942,-7 -4.942,7 ; -4.942,7 cw(c-4.442,7) -3.942,7 ; -3.942,-7 ccw(c-3.442,-7) -2.942,-7 ; -3.942,-7 -3.942,7 ; -3.942,7 cw(c-3.442,7) -2.942,7 ; -2.942,-7 2.942,-7 ; -2.942,-7 -2.942,7 ; -2.942,7 2.942,7 ; 2.942,-7 ccw(c3.442,-7) 3.942,-7 ; 2.942,-7 2.942,7 ; 2.942,7 cw(c3.442,7) 3.942,7 ; 3.942,-7 ccw(c4.442,-7) 4.942,-7 ; 3.942,-7 3.942,7 ; 3.942,7 cw(c4.442,7) 4.942,7 ; 4.942,-7 ccw(c5.442,-7) 5.942,-7 5.942,7 ccw(c5.442,7) 4.942,7 ; 4.942,-7 4.942,7 ; 7.75,-7 cw(c7.25,-7) 6.75,-7 6.75,7 cw(c7.25,7) 7.75,7 ; 7.75,-7 ccw(c8.25,-7) 8.75,-7 ; 7.75,-7 7.75,7 ; 7.75,-7 7.75,7 ; 7.75,7 cw(c8.25,7) 8.75,7 ; 8.75,-7 ccw(c9.25,-7) 9.75,-7 ; 8.75,-7 8.75,7 ; 8.75,-7 8.75,7 ; 8.75,7 cw(c9.25,7) 9.75,7 ; 9.75,-7 ccw(c10.25,-7) 10.75,-7 ; 9.75,-7 9.75,7 ; 9.75,-7 9.75,7 ; 9.75,7 cw(c10.25,7) 10.75,7 ; 10.75,-7 10.75,7 ; 10.75,-7 10.75,7 ; 11.75,-7 ccw(c12.25,-7) 12.75,-7 ; 11.75,-7 11.75,7 ; 11.75,-7 11.75,7 ; 11.75,7 cw(c12.25,7) 12.75,7 ; 12.75,-7 ccw(c13.25,-7) 13.75,-7 ; 12.75,-7 12.75,7 ; 12.75,-7 12.75,7 ; 12.75,7 cw(c13.25,7) 13.75,7 ; 13.75,-7 ccw(c14.25,-7) 14.75,-7 14.75,7 ccw(c14.25,7) 13.75,7 ; 13.75,-7 13.75,7 ; -15.2,-11 -12.6,-11 -12.6,-8.4 -10.2,-8.4 -10.2,-11 -6.9,-11 -6.9,-8.4 -4.5,-8.4 -4.5,-11 -1.2,-11 -1.2,-8.4 1.2,-8.4 1.2,-11 4.5,-11 4.5,-8.4 6.9,-8.4 6.9,-11 10.2,-11 10.2,-8.4 12.6,-8.4 12.6,-11 15.2,-11 15.2,11 12.6,11 12.6,8.4 10.2,8.4 10.2,11 6.9,11 6.9,8.4 4.5,8.4 4.5,11 1.2,11 1.2,8.4 -1.2,8.4 -1.2,11 -4.5,11 -4.5,8.4 -6.9,8.4 -6.9,11 -10.2,11 -10.2,8.4 -12.6,8.4 -12.6,11 -15.2,11 -15.2,-11
  text "12" at -13.3,-10.7 h1.5
  text "1" at -13.3,9.2 h1.5
  text "7" at 14.8,-10.1 h1.5
  text "6" at 14.8,9.1 h1.5
3D body "IND_WURTH_WE-CMB-XL.stp": height 35, standoff -3.8, extent -15.2,-11 15.2,11